# Altium footprint library Connector_Samtec_HLE_THT.PcbLib: 141 footprints (part 5 of 9)
Each footprint in its own frame and in the unit in brackets; x right, y up, seen from the top. Pads: shape width x height; smd on the part's side, far side on the other; paste and mask are expansions set on the pad; w line width, h text height; cw(c..) or ccw(c..) is an arc to the next point about the centre after c.
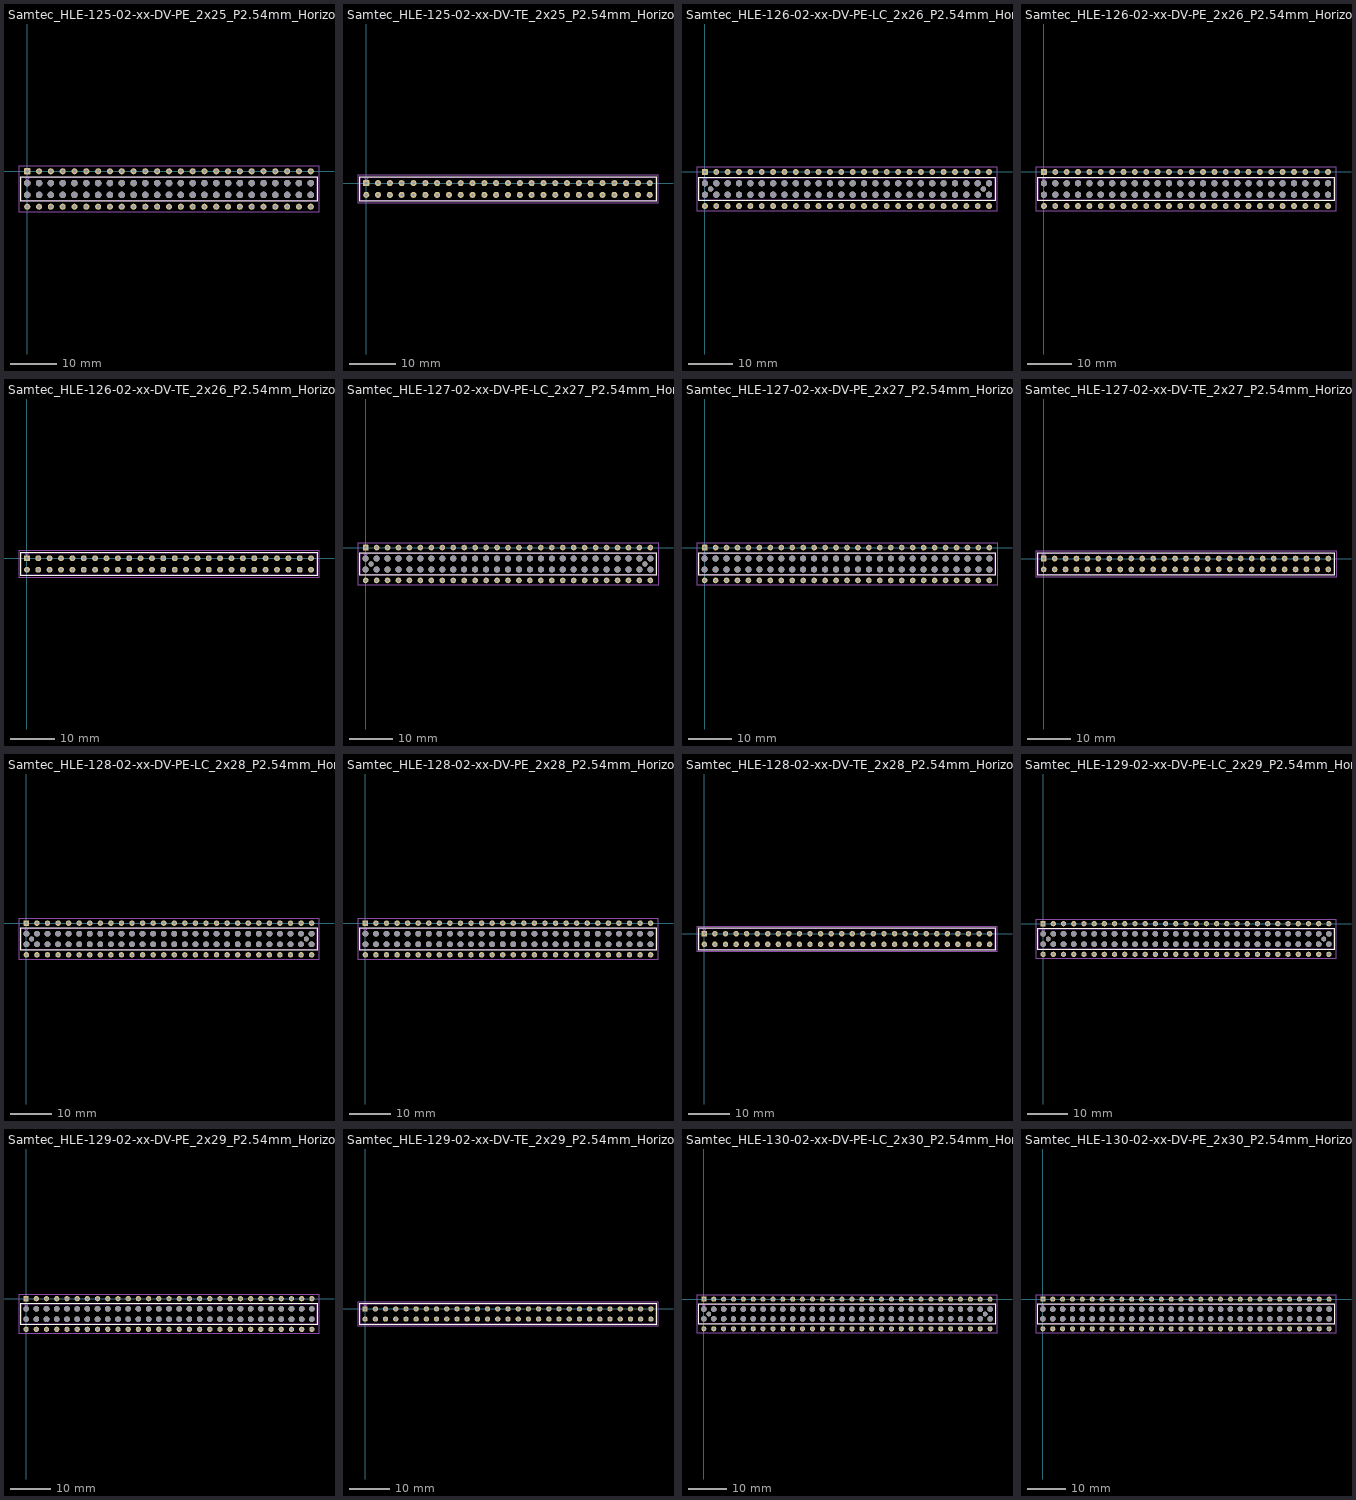
[diagram p4: the footprints below, top view; thin cyan lines are the x and y axes]

## Samtec_HLE-125-02-xx-DV-PE_2x25_P2.54mm_Horizontal [mm]
pads (100):
  rrect19% 1.31x1.31 hole 0.71: 1(0,0)
  round 1.31 hole 0.71: 2(0,-7.62) 3(2.54,0) 4(2.54,-7.62) 5(5.08,0) 6(5.08,-7.62) 7(7.62,0) 8(7.62,-7.62) 9(10.16,0) 10(10.16,-7.62) 11(12.7,0) 12(12.7,-7.62) 13(15.24,0) 14(15.24,-7.62) 15(17.78,0) 16(17.78,-7.62) 17(20.32,0) 18(20.32,-7.62) 19(22.86,0) 20(22.86,-7.62) 21(25.4,0) 22(25.4,-7.62) 23(27.94,0) 24(27.94,-7.62) 25(30.48,0) 26(30.48,-7.62) 27(33.02,0) 28(33.02,-7.62) 29(35.56,0) 30(35.56,-7.62) 31(38.1,0) 32(38.1,-7.62) 33(40.64,0) 34(40.64,-7.62) 35(43.18,0) 36(43.18,-7.62) 37(45.72,0) 38(45.72,-7.62) 39(48.26,0) 40(48.26,-7.62) 41(50.8,0) 42(50.8,-7.62) 43(53.34,0) 44(53.34,-7.62) 45(55.88,0) 46(55.88,-7.62) 47(58.42,0) 48(58.42,-7.62) 49(60.96,0) 50(60.96,-7.62)
  round 1.4 hole 1.4: Un1(35.56,-5.08) Un2(5.08,-2.54) Un3(27.94,-5.08) Un4(58.42,-2.54) Un5(40.64,-2.54) Un6(25.4,-5.08) Un7(43.18,-5.08) Un8(12.7,-5.08) Un9(33.02,-5.08) Un10(55.88,-2.54) Un11(12.7,-2.54) Un12(43.18,-2.54) Un13(53.34,-5.08) Un14(60.96,-2.54) Un15(22.86,-5.08) Un16(17.78,-5.08) Un17(30.48,-2.54) Un18(48.26,-2.54) Un19(0,-5.08) Un20(5.08,-5.08) Un21(55.88,-5.08) Un22(45.72,-5.08) Un23(40.64,-5.08) Un24(15.24,-2.54) Un25(38.1,-5.08) Un26(60.96,-5.08) Un27(17.78,-2.54) Un28(35.56,-2.54) Un29(2.54,-2.54) Un30(10.16,-5.08) Un31(48.26,-5.08) Un32(25.4,-2.54) Un33(58.42,-5.08) Un34(30.48,-5.08) Un35(20.32,-5.08) Un36(15.24,-5.08) Un37(53.34,-2.54) Un38(22.86,-2.54) Un39(33.02,-2.54) Un40(0,-2.54) Un41(2.54,-5.08) Un42(50.8,-2.54) Un43(10.16,-2.54) Un44(27.94,-2.54) Un45(38.1,-2.54) Un46(50.8,-5.08) Un47(7.62,-2.54) Un48(45.72,-2.54) Un49(20.32,-2.54) Un50(7.62,-5.08)
F.SilkS:
  lines w0.12: -1.38,-6.46 -1.38,-1.16 62.34,-1.16 62.34,-6.46 -1.38,-6.46
F.CrtYd:
  lines w0.05: -1.77,-8.78 62.73,-8.78 62.73,1.16 -1.77,1.16 -1.77,-8.78
F.Fab:
  lines w0.1: -0.5,-1.27 0,-1.977 0.5,-1.27 ; -1.27,-6.35 -1.27,-1.27 62.23,-1.27 62.23,-6.35 -1.27,-6.35
  text "'.Designator'" at 26.433,-6.49 h1

## Samtec_HLE-125-02-xx-DV-TE_2x25_P2.54mm_Horizontal [mm]
pads (50):
  rrect19% 1.31x1.31 hole 0.71: 1(0,0)
  round 1.31 hole 0.71: 2(0,-2.54) 3(2.54,0) 4(2.54,-2.54) 5(5.08,0) 6(5.08,-2.54) 7(7.62,0) 8(7.62,-2.54) 9(10.16,0) 10(10.16,-2.54) 11(12.7,0) 12(12.7,-2.54) 13(15.24,0) 14(15.24,-2.54) 15(17.78,0) 16(17.78,-2.54) 17(20.32,0) 18(20.32,-2.54) 19(22.86,0) 20(22.86,-2.54) 21(25.4,0) 22(25.4,-2.54) 23(27.94,0) 24(27.94,-2.54) 25(30.48,0) 26(30.48,-2.54) 27(33.02,0) 28(33.02,-2.54) 29(35.56,0) 30(35.56,-2.54) 31(38.1,0) 32(38.1,-2.54) 33(40.64,0) 34(40.64,-2.54) 35(43.18,0) 36(43.18,-2.54) 37(45.72,0) 38(45.72,-2.54) 39(48.26,0) 40(48.26,-2.54) 41(50.8,0) 42(50.8,-2.54) 43(53.34,0) 44(53.34,-2.54) 45(55.88,0) 46(55.88,-2.54) 47(58.42,0) 48(58.42,-2.54) 49(60.96,0) 50(60.96,-2.54)
F.SilkS:
  lines w0.12: -1.38,-3.92 62.34,-3.92 62.34,1.38 -1.38,1.38 -1.38,-3.92
F.CrtYd:
  lines w0.05: -1.77,-4.31 62.73,-4.31 62.73,1.77 -1.77,1.77 -1.77,-4.31
F.Fab:
  lines w0.1: -0.5,1.27 0,0.563 0.5,1.27 ; -1.27,-3.81 62.23,-3.81 62.23,1.27 -1.27,1.27 -1.27,-3.81
  text "'.Designator'" at 26.433,-3.95 h1

## Samtec_HLE-126-02-xx-DV-PE-LC_2x26_P2.54mm_Horizontal [mm]
pads (106):
  rrect19% 1.31x1.31 hole 0.71: 1(0,0)
  round 1.31 hole 0.71: 2(0,-7.62) 3(2.54,0) 4(2.54,-7.62) 5(5.08,0) 6(5.08,-7.62) 7(7.62,0) 8(7.62,-7.62) 9(10.16,0) 10(10.16,-7.62) 11(12.7,0) 12(12.7,-7.62) 13(15.24,0) 14(15.24,-7.62) 15(17.78,0) 16(17.78,-7.62) 17(20.32,0) 18(20.32,-7.62) 19(22.86,0) 20(22.86,-7.62) 21(25.4,0) 22(25.4,-7.62) 23(27.94,0) 24(27.94,-7.62) 25(30.48,0) 26(30.48,-7.62) 27(33.02,0) 28(33.02,-7.62) 29(35.56,0) 30(35.56,-7.62) 31(38.1,0) 32(38.1,-7.62) 33(40.64,0) 34(40.64,-7.62) 35(43.18,0) 36(43.18,-7.62) 37(45.72,0) 38(45.72,-7.62) 39(48.26,0) 40(48.26,-7.62) 41(50.8,0) 42(50.8,-7.62) 43(53.34,0) 44(53.34,-7.62) 45(55.88,0) 46(55.88,-7.62) 47(58.42,0) 48(58.42,-7.62) 49(60.96,0) 50(60.96,-7.62) 51(63.5,0) 52(63.5,-7.62)
  round 1.4 hole 1.4: Un1(58.42,-2.54) Un2(22.86,-5.08) Un3(53.34,-5.08) Un4(20.32,-2.54) Un5(48.26,-5.08) Un6(5.08,-2.54) Un7(48.26,-2.54) Un8(2.54,-5.08) Un9(55.88,-2.54) Un10(40.64,-2.54) Un11(10.16,-2.54) Un12(15.24,-2.54) Un13(60.96,-2.54) Un14(53.34,-2.54) Un15(35.56,-2.54) Un16(17.78,-2.54) Un17(5.08,-5.08) Un18(50.8,-2.54) Un19(38.1,-5.08) Un20(25.4,-2.54) Un22(43.18,-5.08) Un23(50.8,-5.08) Un24(30.48,-5.08) Un25(60.96,-5.08) Un26(12.7,-5.08) Un27(20.32,-5.08) Un28(63.5,-2.54) Un29(30.48,-2.54) Un30(10.16,-5.08) Un31(27.94,-5.08) Un32(12.7,-2.54) Un33(63.5,-5.08) Un34(0,-5.08) Un35(25.4,-5.08) Un36(55.88,-5.08) Un37(17.78,-5.08) Un39(38.1,-2.54) Un40(43.18,-2.54) Un41(27.94,-2.54) Un42(2.54,-2.54) Un43(33.02,-2.54) Un44(22.86,-2.54) Un45(45.72,-2.54) Un46(35.56,-5.08) Un47(15.24,-5.08) Un48(0,-2.54) Un49(7.62,-2.54) Un50(45.72,-5.08) Un51(58.42,-5.08) Un52(40.64,-5.08) Un53(33.02,-5.08) Un54(7.62,-5.08)
  round 1.19 hole 1.19: Un21(1.27,-3.81) Un38(62.23,-3.81)
F.SilkS:
  lines w0.12: -1.38,-6.46 -1.38,-1.16 64.88,-1.16 64.88,-6.46 -1.38,-6.46
F.CrtYd:
  lines w0.05: -1.77,-8.78 65.27,-8.78 65.27,1.16 -1.77,1.16 -1.77,-8.78
F.Fab:
  lines w0.1: -0.5,-1.27 0,-1.977 0.5,-1.27 ; -1.27,-6.35 64.77,-6.35 64.77,-1.27 -1.27,-1.27 -1.27,-6.35
  text "'.Designator'" at 27.703,-6.49 h1

## Samtec_HLE-126-02-xx-DV-PE_2x26_P2.54mm_Horizontal [mm]
pads (104):
  rrect19% 1.31x1.31 hole 0.71: 1(0,0)
  round 1.31 hole 0.71: 2(0,-7.62) 3(2.54,0) 4(2.54,-7.62) 5(5.08,0) 6(5.08,-7.62) 7(7.62,0) 8(7.62,-7.62) 9(10.16,0) 10(10.16,-7.62) 11(12.7,0) 12(12.7,-7.62) 13(15.24,0) 14(15.24,-7.62) 15(17.78,0) 16(17.78,-7.62) 17(20.32,0) 18(20.32,-7.62) 19(22.86,0) 20(22.86,-7.62) 21(25.4,0) 22(25.4,-7.62) 23(27.94,0) 24(27.94,-7.62) 25(30.48,0) 26(30.48,-7.62) 27(33.02,0) 28(33.02,-7.62) 29(35.56,0) 30(35.56,-7.62) 31(38.1,0) 32(38.1,-7.62) 33(40.64,0) 34(40.64,-7.62) 35(43.18,0) 36(43.18,-7.62) 37(45.72,0) 38(45.72,-7.62) 39(48.26,0) 40(48.26,-7.62) 41(50.8,0) 42(50.8,-7.62) 43(53.34,0) 44(53.34,-7.62) 45(55.88,0) 46(55.88,-7.62) 47(58.42,0) 48(58.42,-7.62) 49(60.96,0) 50(60.96,-7.62) 51(63.5,0) 52(63.5,-7.62)
  round 1.4 hole 1.4: Un1(17.78,-5.08) Un2(10.16,-5.08) Un3(5.08,-5.08) Un4(7.62,-5.08) Un5(17.78,-2.54) Un6(7.62,-2.54) Un7(10.16,-2.54) Un8(15.24,-5.08) Un9(48.26,-2.54) Un10(38.1,-5.08) Un11(58.42,-5.08) Un12(45.72,-5.08) Un13(40.64,-2.54) Un14(55.88,-5.08) Un15(63.5,-2.54) Un16(35.56,-5.08) Un17(2.54,-2.54) Un18(25.4,-2.54) Un19(53.34,-5.08) Un20(33.02,-2.54) Un21(25.4,-5.08) Un22(43.18,-5.08) Un23(0,-5.08) Un24(20.32,-2.54) Un25(60.96,-2.54) Un26(53.34,-2.54) Un27(30.48,-5.08) Un28(38.1,-2.54) Un29(12.7,-2.54) Un30(2.54,-5.08) Un31(33.02,-5.08) Un32(5.08,-2.54) Un33(40.64,-5.08) Un34(55.88,-2.54) Un35(63.5,-5.08) Un36(15.24,-2.54) Un37(27.94,-2.54) Un38(50.8,-5.08) Un39(22.86,-2.54) Un40(45.72,-2.54) Un41(48.26,-5.08) Un42(30.48,-2.54) Un43(12.7,-5.08) Un44(50.8,-2.54) Un45(27.94,-5.08) Un46(22.86,-5.08) Un47(58.42,-2.54) Un48(0,-2.54) Un49(35.56,-2.54) Un50(20.32,-5.08) Un51(43.18,-2.54) Un52(60.96,-5.08)
F.SilkS:
  lines w0.12: -1.38,-6.46 64.88,-6.46 64.88,-1.16 -1.38,-1.16 -1.38,-6.46
F.CrtYd:
  lines w0.05: -1.77,-8.78 -1.77,1.16 65.27,1.16 65.27,-8.78 -1.77,-8.78
F.Fab:
  lines w0.1: -0.5,-1.27 0,-1.977 0.5,-1.27 ; -1.27,-6.35 64.77,-6.35 64.77,-1.27 -1.27,-1.27 -1.27,-6.35
  text "'.Designator'" at 27.703,-6.49 h1

## Samtec_HLE-126-02-xx-DV-TE_2x26_P2.54mm_Horizontal [mm]
pads (52):
  rrect19% 1.31x1.31 hole 0.71: 1(0,0)
  round 1.31 hole 0.71: 2(0,-2.54) 3(2.54,0) 4(2.54,-2.54) 5(5.08,0) 6(5.08,-2.54) 7(7.62,0) 8(7.62,-2.54) 9(10.16,0) 10(10.16,-2.54) 11(12.7,0) 12(12.7,-2.54) 13(15.24,0) 14(15.24,-2.54) 15(17.78,0) 16(17.78,-2.54) 17(20.32,0) 18(20.32,-2.54) 19(22.86,0) 20(22.86,-2.54) 21(25.4,0) 22(25.4,-2.54) 23(27.94,0) 24(27.94,-2.54) 25(30.48,0) 26(30.48,-2.54) 27(33.02,0) 28(33.02,-2.54) 29(35.56,0) 30(35.56,-2.54) 31(38.1,0) 32(38.1,-2.54) 33(40.64,0) 34(40.64,-2.54) 35(43.18,0) 36(43.18,-2.54) 37(45.72,0) 38(45.72,-2.54) 39(48.26,0) 40(48.26,-2.54) 41(50.8,0) 42(50.8,-2.54) 43(53.34,0) 44(53.34,-2.54) 45(55.88,0) 46(55.88,-2.54) 47(58.42,0) 48(58.42,-2.54) 49(60.96,0) 50(60.96,-2.54) 51(63.5,0) 52(63.5,-2.54)
F.SilkS:
  lines w0.12: -1.38,-3.92 -1.38,1.38 64.88,1.38 64.88,-3.92 -1.38,-3.92
F.CrtYd:
  lines w0.05: -1.77,-4.31 65.27,-4.31 65.27,1.77 -1.77,1.77 -1.77,-4.31
F.Fab:
  lines w0.1: -0.5,1.27 0,0.563 0.5,1.27 ; -1.27,-3.81 -1.27,1.27 64.77,1.27 64.77,-3.81 -1.27,-3.81
  text "'.Designator'" at 27.703,-3.95 h1

## Samtec_HLE-127-02-xx-DV-PE-LC_2x27_P2.54mm_Horizontal [mm]
pads (110):
  rrect19% 1.31x1.31 hole 0.71: 1(0,0)
  round 1.31 hole 0.71: 2(0,-7.62) 3(2.54,0) 4(2.54,-7.62) 5(5.08,0) 6(5.08,-7.62) 7(7.62,0) 8(7.62,-7.62) 9(10.16,0) 10(10.16,-7.62) 11(12.7,0) 12(12.7,-7.62) 13(15.24,0) 14(15.24,-7.62) 15(17.78,0) 16(17.78,-7.62) 17(20.32,0) 18(20.32,-7.62) 19(22.86,0) 20(22.86,-7.62) 21(25.4,0) 22(25.4,-7.62) 23(27.94,0) 24(27.94,-7.62) 25(30.48,0) 26(30.48,-7.62) 27(33.02,0) 28(33.02,-7.62) 29(35.56,0) 30(35.56,-7.62) 31(38.1,0) 32(38.1,-7.62) 33(40.64,0) 34(40.64,-7.62) 35(43.18,0) 36(43.18,-7.62) 37(45.72,0) 38(45.72,-7.62) 39(48.26,0) 40(48.26,-7.62) 41(50.8,0) 42(50.8,-7.62) 43(53.34,0) 44(53.34,-7.62) 45(55.88,0) 46(55.88,-7.62) 47(58.42,0) 48(58.42,-7.62) 49(60.96,0) 50(60.96,-7.62) 51(63.5,0) 52(63.5,-7.62) 53(66.04,0) 54(66.04,-7.62)
  round 1.4 hole 1.4: Un1(7.62,-5.08) Un2(66.04,-2.54) Un3(0,-5.08) Un4(48.26,-2.54) Un5(27.94,-2.54) Un6(0,-2.54) Un7(17.78,-2.54) Un8(40.64,-5.08) Un9(25.4,-2.54) Un10(30.48,-5.08) Un11(15.24,-5.08) Un12(45.72,-2.54) Un13(30.48,-2.54) Un14(25.4,-5.08) Un15(40.64,-2.54) Un16(48.26,-5.08) Un17(2.54,-2.54) Un18(17.78,-5.08) Un19(22.86,-2.54) Un20(60.96,-5.08) Un22(55.88,-5.08) Un23(33.02,-5.08) Un24(50.8,-2.54) Un25(60.96,-2.54) Un26(22.86,-5.08) Un27(12.7,-5.08) Un28(10.16,-2.54) Un29(43.18,-5.08) Un30(35.56,-5.08) Un31(50.8,-5.08) Un32(38.1,-2.54) Un33(27.94,-5.08) Un34(55.88,-2.54) Un35(45.72,-5.08) Un37(15.24,-2.54) Un38(20.32,-2.54) Un39(35.56,-2.54) Un40(43.18,-2.54) Un41(38.1,-5.08) Un42(58.42,-5.08) Un43(53.34,-2.54) Un44(63.5,-2.54) Un45(58.42,-2.54) Un46(20.32,-5.08) Un47(7.62,-2.54) Un48(2.54,-5.08) Un49(33.02,-2.54) Un50(12.7,-2.54) Un51(63.5,-5.08) Un52(66.04,-5.08) Un53(10.16,-5.08) Un54(53.34,-5.08) Un55(5.08,-2.54) Un56(5.08,-5.08)
  round 1.19 hole 1.19: Un21(64.77,-3.81) Un36(1.27,-3.81)
F.SilkS:
  lines w0.12: -1.38,-6.46 67.42,-6.46 67.42,-1.16 -1.38,-1.16 -1.38,-6.46
F.CrtYd:
  lines w0.05: -1.77,-8.78 -1.77,1.16 67.81,1.16 67.81,-8.78 -1.77,-8.78
F.Fab:
  lines w0.1: -0.5,-1.27 0,-1.977 0.5,-1.27 ; -1.27,-6.35 -1.27,-1.27 67.31,-1.27 67.31,-6.35 -1.27,-6.35
  text "'.Designator'" at 28.973,-6.49 h1

## Samtec_HLE-127-02-xx-DV-PE_2x27_P2.54mm_Horizontal [mm]
pads (108):
  rrect19% 1.31x1.31 hole 0.71: 1(0,0)
  round 1.31 hole 0.71: 2(0,-7.62) 3(2.54,0) 4(2.54,-7.62) 5(5.08,0) 6(5.08,-7.62) 7(7.62,0) 8(7.62,-7.62) 9(10.16,0) 10(10.16,-7.62) 11(12.7,0) 12(12.7,-7.62) 13(15.24,0) 14(15.24,-7.62) 15(17.78,0) 16(17.78,-7.62) 17(20.32,0) 18(20.32,-7.62) 19(22.86,0) 20(22.86,-7.62) 21(25.4,0) 22(25.4,-7.62) 23(27.94,0) 24(27.94,-7.62) 25(30.48,0) 26(30.48,-7.62) 27(33.02,0) 28(33.02,-7.62) 29(35.56,0) 30(35.56,-7.62) 31(38.1,0) 32(38.1,-7.62) 33(40.64,0) 34(40.64,-7.62) 35(43.18,0) 36(43.18,-7.62) 37(45.72,0) 38(45.72,-7.62) 39(48.26,0) 40(48.26,-7.62) 41(50.8,0) 42(50.8,-7.62) 43(53.34,0) 44(53.34,-7.62) 45(55.88,0) 46(55.88,-7.62) 47(58.42,0) 48(58.42,-7.62) 49(60.96,0) 50(60.96,-7.62) 51(63.5,0) 52(63.5,-7.62) 53(66.04,0) 54(66.04,-7.62)
  round 1.4 hole 1.4: Un1(22.86,-5.08) Un2(0,-5.08) Un3(55.88,-2.54) Un4(53.34,-5.08) Un5(35.56,-5.08) Un6(15.24,-2.54) Un7(43.18,-5.08) Un8(5.08,-5.08) Un9(50.8,-2.54) Un10(60.96,-2.54) Un11(33.02,-2.54) Un12(2.54,-2.54) Un13(27.94,-5.08) Un14(35.56,-2.54) Un15(27.94,-2.54) Un16(40.64,-2.54) Un17(66.04,-2.54) Un18(12.7,-2.54) Un19(55.88,-5.08) Un20(45.72,-5.08) Un21(48.26,-5.08) Un22(2.54,-5.08) Un23(17.78,-5.08) Un24(43.18,-2.54) Un25(48.26,-2.54) Un26(63.5,-5.08) Un27(25.4,-5.08) Un28(7.62,-5.08) Un29(45.72,-2.54) Un30(38.1,-2.54) Un31(0,-2.54) Un32(30.48,-5.08) Un33(30.48,-2.54) Un34(15.24,-5.08) Un35(7.62,-2.54) Un36(25.4,-2.54) Un37(63.5,-2.54) Un38(58.42,-5.08) Un39(40.64,-5.08) Un40(10.16,-2.54) Un41(58.42,-2.54) Un42(33.02,-5.08) Un43(66.04,-5.08) Un44(17.78,-2.54) Un45(20.32,-5.08) Un46(22.86,-2.54) Un47(60.96,-5.08) Un48(5.08,-2.54) Un49(50.8,-5.08) Un50(12.7,-5.08) Un51(53.34,-2.54) Un52(38.1,-5.08) Un53(20.32,-2.54) Un54(10.16,-5.08)
F.SilkS:
  lines w0.12: -1.38,-6.46 67.42,-6.46 67.42,-1.16 -1.38,-1.16 -1.38,-6.46
F.CrtYd:
  lines w0.05: -1.77,-8.78 -1.77,1.16 67.81,1.16 67.81,-8.78 -1.77,-8.78
F.Fab:
  lines w0.1: -0.5,-1.27 0,-1.977 0.5,-1.27 ; -1.27,-6.35 -1.27,-1.27 67.31,-1.27 67.31,-6.35 -1.27,-6.35
  text "'.Designator'" at 28.973,-6.49 h1

## Samtec_HLE-127-02-xx-DV-TE_2x27_P2.54mm_Horizontal [mm]
pads (54):
  rrect19% 1.31x1.31 hole 0.71: 1(0,0)
  round 1.31 hole 0.71: 2(0,-2.54) 3(2.54,0) 4(2.54,-2.54) 5(5.08,0) 6(5.08,-2.54) 7(7.62,0) 8(7.62,-2.54) 9(10.16,0) 10(10.16,-2.54) 11(12.7,0) 12(12.7,-2.54) 13(15.24,0) 14(15.24,-2.54) 15(17.78,0) 16(17.78,-2.54) 17(20.32,0) 18(20.32,-2.54) 19(22.86,0) 20(22.86,-2.54) 21(25.4,0) 22(25.4,-2.54) 23(27.94,0) 24(27.94,-2.54) 25(30.48,0) 26(30.48,-2.54) 27(33.02,0) 28(33.02,-2.54) 29(35.56,0) 30(35.56,-2.54) 31(38.1,0) 32(38.1,-2.54) 33(40.64,0) 34(40.64,-2.54) 35(43.18,0) 36(43.18,-2.54) 37(45.72,0) 38(45.72,-2.54) 39(48.26,0) 40(48.26,-2.54) 41(50.8,0) 42(50.8,-2.54) 43(53.34,0) 44(53.34,-2.54) 45(55.88,0) 46(55.88,-2.54) 47(58.42,0) 48(58.42,-2.54) 49(60.96,0) 50(60.96,-2.54) 51(63.5,0) 52(63.5,-2.54) 53(66.04,0) 54(66.04,-2.54)
F.SilkS:
  lines w0.12: -1.38,-3.92 -1.38,1.38 67.42,1.38 67.42,-3.92 -1.38,-3.92
F.CrtYd:
  lines w0.05: -1.77,-4.31 -1.77,1.77 67.81,1.77 67.81,-4.31 -1.77,-4.31
F.Fab:
  lines w0.1: -0.5,1.27 0,0.563 0.5,1.27 ; -1.27,-3.81 67.31,-3.81 67.31,1.27 -1.27,1.27 -1.27,-3.81
  text "'.Designator'" at 28.973,-3.95 h1

## Samtec_HLE-128-02-xx-DV-PE-LC_2x28_P2.54mm_Horizontal [mm]
pads (114):
  rrect19% 1.31x1.31 hole 0.71: 1(0,0)
  round 1.31 hole 0.71: 2(0,-7.62) 3(2.54,0) 4(2.54,-7.62) 5(5.08,0) 6(5.08,-7.62) 7(7.62,0) 8(7.62,-7.62) 9(10.16,0) 10(10.16,-7.62) 11(12.7,0) 12(12.7,-7.62) 13(15.24,0) 14(15.24,-7.62) 15(17.78,0) 16(17.78,-7.62) 17(20.32,0) 18(20.32,-7.62) 19(22.86,0) 20(22.86,-7.62) 21(25.4,0) 22(25.4,-7.62) 23(27.94,0) 24(27.94,-7.62) 25(30.48,0) 26(30.48,-7.62) 27(33.02,0) 28(33.02,-7.62) 29(35.56,0) 30(35.56,-7.62) 31(38.1,0) 32(38.1,-7.62) 33(40.64,0) 34(40.64,-7.62) 35(43.18,0) 36(43.18,-7.62) 37(45.72,0) 38(45.72,-7.62) 39(48.26,0) 40(48.26,-7.62) 41(50.8,0) 42(50.8,-7.62) 43(53.34,0) 44(53.34,-7.62) 45(55.88,0) 46(55.88,-7.62) 47(58.42,0) 48(58.42,-7.62) 49(60.96,0) 50(60.96,-7.62) 51(63.5,0) 52(63.5,-7.62) 53(66.04,0) 54(66.04,-7.62) 55(68.58,0) 56(68.58,-7.62)
  round 1.4 hole 1.4: Un1(66.04,-2.54) Un2(5.08,-5.08) Un3(63.5,-5.08) Un4(2.54,-2.54) Un5(40.64,-5.08) Un6(66.04,-5.08) Un7(53.34,-5.08) Un8(12.7,-2.54) Un9(2.54,-5.08) Un10(30.48,-2.54) Un11(50.8,-5.08) Un12(63.5,-2.54) Un13(15.24,-2.54) Un14(33.02,-2.54) Un15(48.26,-2.54) Un16(20.32,-2.54) Un17(45.72,-2.54) Un18(30.48,-5.08) Un19(25.4,-2.54) Un20(7.62,-5.08) Un21(27.94,-5.08) Un22(0,-5.08) Un23(45.72,-5.08) Un24(58.42,-5.08) Un25(33.02,-5.08) Un26(38.1,-2.54) Un28(12.7,-5.08) Un29(43.18,-5.08) Un31(53.34,-2.54) Un32(35.56,-5.08) Un33(5.08,-2.54) Un34(68.58,-2.54) Un35(55.88,-2.54) Un36(48.26,-5.08) Un37(22.86,-5.08) Un38(60.96,-5.08) Un39(35.56,-2.54) Un40(20.32,-5.08) Un41(17.78,-2.54) Un42(0,-2.54) Un43(17.78,-5.08) Un44(22.86,-2.54) Un45(10.16,-2.54) Un46(15.24,-5.08) Un47(60.96,-2.54) Un48(43.18,-2.54) Un49(38.1,-5.08) Un50(50.8,-2.54) Un51(27.94,-2.54) Un52(40.64,-2.54) Un53(7.62,-2.54) Un54(58.42,-2.54) Un55(55.88,-5.08) Un56(68.58,-5.08) Un57(10.16,-5.08) Un58(25.4,-5.08)
  round 1.19 hole 1.19: Un27(67.31,-3.81) Un30(1.27,-3.81)
F.SilkS:
  lines w0.12: -1.38,-6.46 -1.38,-1.16 69.96,-1.16 69.96,-6.46 -1.38,-6.46
F.CrtYd:
  lines w0.05: -1.77,-8.78 -1.77,1.16 70.35,1.16 70.35,-8.78 -1.77,-8.78
F.Fab:
  lines w0.1: -0.5,-1.27 0,-1.977 0.5,-1.27 ; -1.27,-6.35 -1.27,-1.27 69.85,-1.27 69.85,-6.35 -1.27,-6.35
  text "'.Designator'" at 30.243,-6.49 h1

## Samtec_HLE-128-02-xx-DV-PE_2x28_P2.54mm_Horizontal [mm]
pads (112):
  rrect19% 1.31x1.31 hole 0.71: 1(0,0)
  round 1.31 hole 0.71: 2(0,-7.62) 3(2.54,0) 4(2.54,-7.62) 5(5.08,0) 6(5.08,-7.62) 7(7.62,0) 8(7.62,-7.62) 9(10.16,0) 10(10.16,-7.62) 11(12.7,0) 12(12.7,-7.62) 13(15.24,0) 14(15.24,-7.62) 15(17.78,0) 16(17.78,-7.62) 17(20.32,0) 18(20.32,-7.62) 19(22.86,0) 20(22.86,-7.62) 21(25.4,0) 22(25.4,-7.62) 23(27.94,0) 24(27.94,-7.62) 25(30.48,0) 26(30.48,-7.62) 27(33.02,0) 28(33.02,-7.62) 29(35.56,0) 30(35.56,-7.62) 31(38.1,0) 32(38.1,-7.62) 33(40.64,0) 34(40.64,-7.62) 35(43.18,0) 36(43.18,-7.62) 37(45.72,0) 38(45.72,-7.62) 39(48.26,0) 40(48.26,-7.62) 41(50.8,0) 42(50.8,-7.62) 43(53.34,0) 44(53.34,-7.62) 45(55.88,0) 46(55.88,-7.62) 47(58.42,0) 48(58.42,-7.62) 49(60.96,0) 50(60.96,-7.62) 51(63.5,0) 52(63.5,-7.62) 53(66.04,0) 54(66.04,-7.62) 55(68.58,0) 56(68.58,-7.62)
  round 1.4 hole 1.4: Un1(33.02,-2.54) Un2(2.54,-2.54) Un3(45.72,-2.54) Un4(5.08,-5.08) Un5(58.42,-2.54) Un6(17.78,-2.54) Un7(55.88,-5.08) Un8(22.86,-5.08) Un9(63.5,-5.08) Un10(2.54,-5.08) Un11(48.26,-5.08) Un12(5.08,-2.54) Un13(30.48,-2.54) Un14(27.94,-5.08) Un15(60.96,-2.54) Un16(15.24,-5.08) Un17(10.16,-2.54) Un18(12.7,-2.54) Un19(48.26,-2.54) Un20(38.1,-5.08) Un21(33.02,-5.08) Un22(68.58,-2.54) Un23(20.32,-2.54) Un24(43.18,-5.08) Un25(17.78,-5.08) Un26(43.18,-2.54) Un27(10.16,-5.08) Un28(0,-2.54) Un29(12.7,-5.08) Un30(66.04,-2.54) Un31(30.48,-5.08) Un32(58.42,-5.08) Un33(53.34,-2.54) Un34(60.96,-5.08) Un35(55.88,-2.54) Un36(50.8,-2.54) Un37(66.04,-5.08) Un38(38.1,-2.54) Un39(53.34,-5.08) Un40(7.62,-5.08) Un41(50.8,-5.08) Un42(25.4,-5.08) Un43(63.5,-2.54) Un44(35.56,-5.08) Un45(25.4,-2.54) Un46(68.58,-5.08) Un47(40.64,-2.54) Un48(7.62,-2.54) Un49(27.94,-2.54) Un50(20.32,-5.08) Un51(15.24,-2.54) Un52(22.86,-2.54) Un53(45.72,-5.08) Un54(35.56,-2.54) Un55(0,-5.08) Un56(40.64,-5.08)
F.SilkS:
  lines w0.12: -1.38,-6.46 -1.38,-1.16 69.96,-1.16 69.96,-6.46 -1.38,-6.46
F.CrtYd:
  lines w0.05: -1.77,-8.78 70.35,-8.78 70.35,1.16 -1.77,1.16 -1.77,-8.78
F.Fab:
  lines w0.1: -0.5,-1.27 0,-1.977 0.5,-1.27 ; -1.27,-6.35 69.85,-6.35 69.85,-1.27 -1.27,-1.27 -1.27,-6.35
  text "'.Designator'" at 30.243,-6.49 h1

## Samtec_HLE-128-02-xx-DV-TE_2x28_P2.54mm_Horizontal [mm]
pads (56):
  rrect19% 1.31x1.31 hole 0.71: 1(0,0)
  round 1.31 hole 0.71: 2(0,-2.54) 3(2.54,0) 4(2.54,-2.54) 5(5.08,0) 6(5.08,-2.54) 7(7.62,0) 8(7.62,-2.54) 9(10.16,0) 10(10.16,-2.54) 11(12.7,0) 12(12.7,-2.54) 13(15.24,0) 14(15.24,-2.54) 15(17.78,0) 16(17.78,-2.54) 17(20.32,0) 18(20.32,-2.54) 19(22.86,0) 20(22.86,-2.54) 21(25.4,0) 22(25.4,-2.54) 23(27.94,0) 24(27.94,-2.54) 25(30.48,0) 26(30.48,-2.54) 27(33.02,0) 28(33.02,-2.54) 29(35.56,0) 30(35.56,-2.54) 31(38.1,0) 32(38.1,-2.54) 33(40.64,0) 34(40.64,-2.54) 35(43.18,0) 36(43.18,-2.54) 37(45.72,0) 38(45.72,-2.54) 39(48.26,0) 40(48.26,-2.54) 41(50.8,0) 42(50.8,-2.54) 43(53.34,0) 44(53.34,-2.54) 45(55.88,0) 46(55.88,-2.54) 47(58.42,0) 48(58.42,-2.54) 49(60.96,0) 50(60.96,-2.54) 51(63.5,0) 52(63.5,-2.54) 53(66.04,0) 54(66.04,-2.54) 55(68.58,0) 56(68.58,-2.54)
F.SilkS:
  lines w0.12: -1.38,-3.92 69.96,-3.92 69.96,1.38 -1.38,1.38 -1.38,-3.92
F.CrtYd:
  lines w0.05: -1.77,-4.31 70.35,-4.31 70.35,1.77 -1.77,1.77 -1.77,-4.31
F.Fab:
  lines w0.1: -0.5,1.27 0,0.563 0.5,1.27 ; -1.27,-3.81 69.85,-3.81 69.85,1.27 -1.27,1.27 -1.27,-3.81
  text "'.Designator'" at 30.243,-3.95 h1

## Samtec_HLE-129-02-xx-DV-PE-LC_2x29_P2.54mm_Horizontal [mm]
pads (118):
  rrect19% 1.31x1.31 hole 0.71: 1(0,0)
  round 1.31 hole 0.71: 2(0,-7.62) 3(2.54,0) 4(2.54,-7.62) 5(5.08,0) 6(5.08,-7.62) 7(7.62,0) 8(7.62,-7.62) 9(10.16,0) 10(10.16,-7.62) 11(12.7,0) 12(12.7,-7.62) 13(15.24,0) 14(15.24,-7.62) 15(17.78,0) 16(17.78,-7.62) 17(20.32,0) 18(20.32,-7.62) 19(22.86,0) 20(22.86,-7.62) 21(25.4,0) 22(25.4,-7.62) 23(27.94,0) 24(27.94,-7.62) 25(30.48,0) 26(30.48,-7.62) 27(33.02,0) 28(33.02,-7.62) 29(35.56,0) 30(35.56,-7.62) 31(38.1,0) 32(38.1,-7.62) 33(40.64,0) 34(40.64,-7.62) 35(43.18,0) 36(43.18,-7.62) 37(45.72,0) 38(45.72,-7.62) 39(48.26,0) 40(48.26,-7.62) 41(50.8,0) 42(50.8,-7.62) 43(53.34,0) 44(53.34,-7.62) 45(55.88,0) 46(55.88,-7.62) 47(58.42,0) 48(58.42,-7.62) 49(60.96,0) 50(60.96,-7.62) 51(63.5,0) 52(63.5,-7.62) 53(66.04,0) 54(66.04,-7.62) 55(68.58,0) 56(68.58,-7.62) 57(71.12,0) 58(71.12,-7.62)
  round 1.4 hole 1.4: Un1(35.56,-5.08) Un2(30.48,-5.08) Un3(55.88,-5.08) Un4(33.02,-2.54) Un5(20.32,-2.54) Un6(53.34,-5.08) Un7(5.08,-5.08) Un8(2.54,-5.08) Un9(40.64,-2.54) Un10(45.72,-2.54) Un11(35.56,-2.54) Un12(12.7,-2.54) Un13(45.72,-5.08) Un14(66.04,-5.08) Un15(71.12,-5.08) Un16(63.5,-2.54) Un17(27.94,-2.54) Un18(53.34,-2.54) Un19(55.88,-2.54) Un20(43.18,-2.54) Un21(68.58,-2.54) Un22(30.48,-2.54) Un23(48.26,-5.08) Un24(15.24,-2.54) Un25(10.16,-5.08) Un26(7.62,-2.54) Un27(68.58,-5.08) Un28(63.5,-5.08) Un30(38.1,-2.54) Un31(17.78,-5.08) Un32(10.16,-2.54) Un33(50.8,-5.08) Un34(2.54,-2.54) Un35(27.94,-5.08) Un36(22.86,-2.54) Un37(66.04,-2.54) Un38(33.02,-5.08) Un40(20.32,-5.08) Un41(7.62,-5.08) Un42(0,-5.08) Un43(17.78,-2.54) Un44(25.4,-2.54) Un45(12.7,-5.08) Un46(0,-2.54) Un47(40.64,-5.08) Un48(60.96,-2.54) Un49(25.4,-5.08) Un50(50.8,-2.54) Un51(22.86,-5.08) Un52(43.18,-5.08) Un53(15.24,-5.08) Un54(58.42,-5.08) Un55(38.1,-5.08) Un56(5.08,-2.54) Un57(60.96,-5.08) Un58(71.12,-2.54) Un59(58.42,-2.54) Un60(48.26,-2.54)
  round 1.19 hole 1.19: Un29(69.85,-3.81) Un39(1.27,-3.81)
F.SilkS:
  lines w0.12: -1.38,-6.46 72.5,-6.46 72.5,-1.16 -1.38,-1.16 -1.38,-6.46
F.CrtYd:
  lines w0.05: -1.77,-8.78 72.89,-8.78 72.89,1.16 -1.77,1.16 -1.77,-8.78
F.Fab:
  lines w0.1: -0.5,-1.27 0,-1.977 0.5,-1.27 ; -1.27,-6.35 -1.27,-1.27 72.39,-1.27 72.39,-6.35 -1.27,-6.35
  text "'.Designator'" at 31.513,-6.49 h1

## Samtec_HLE-129-02-xx-DV-PE_2x29_P2.54mm_Horizontal [mm]
pads (116):
  rrect19% 1.31x1.31 hole 0.71: 1(0,0)
  round 1.31 hole 0.71: 2(0,-7.62) 3(2.54,0) 4(2.54,-7.62) 5(5.08,0) 6(5.08,-7.62) 7(7.62,0) 8(7.62,-7.62) 9(10.16,0) 10(10.16,-7.62) 11(12.7,0) 12(12.7,-7.62) 13(15.24,0) 14(15.24,-7.62) 15(17.78,0) 16(17.78,-7.62) 17(20.32,0) 18(20.32,-7.62) 19(22.86,0) 20(22.86,-7.62) 21(25.4,0) 22(25.4,-7.62) 23(27.94,0) 24(27.94,-7.62) 25(30.48,0) 26(30.48,-7.62) 27(33.02,0) 28(33.02,-7.62) 29(35.56,0) 30(35.56,-7.62) 31(38.1,0) 32(38.1,-7.62) 33(40.64,0) 34(40.64,-7.62) 35(43.18,0) 36(43.18,-7.62) 37(45.72,0) 38(45.72,-7.62) 39(48.26,0) 40(48.26,-7.62) 41(50.8,0) 42(50.8,-7.62) 43(53.34,0) 44(53.34,-7.62) 45(55.88,0) 46(55.88,-7.62) 47(58.42,0) 48(58.42,-7.62) 49(60.96,0) 50(60.96,-7.62) 51(63.5,0) 52(63.5,-7.62) 53(66.04,0) 54(66.04,-7.62) 55(68.58,0) 56(68.58,-7.62) 57(71.12,0) 58(71.12,-7.62)
  round 1.4 hole 1.4: Un1(17.78,-5.08) Un2(71.12,-5.08) Un3(53.34,-5.08) Un4(53.34,-2.54) Un5(66.04,-2.54) Un6(30.48,-5.08) Un7(43.18,-5.08) Un8(25.4,-2.54) Un9(71.12,-2.54) Un10(43.18,-2.54) Un11(63.5,-5.08) Un12(50.8,-5.08) Un13(58.42,-5.08) Un14(10.16,-5.08) Un15(30.48,-2.54) Un16(55.88,-5.08) Un17(35.56,-2.54) Un18(22.86,-5.08) Un19(27.94,-5.08) Un20(17.78,-2.54) Un21(45.72,-5.08) Un22(33.02,-5.08) Un23(0,-2.54) Un24(2.54,-5.08) Un25(66.04,-5.08) Un26(40.64,-2.54) Un27(5.08,-5.08) Un28(68.58,-5.08) Un29(50.8,-2.54) Un30(60.96,-5.08) Un31(12.7,-2.54) Un32(0,-5.08) Un33(12.7,-5.08) Un34(35.56,-5.08) Un35(68.58,-2.54) Un36(40.64,-5.08) Un37(20.32,-5.08) Un38(20.32,-2.54) Un39(63.5,-2.54) Un40(38.1,-2.54) Un41(15.24,-2.54) Un42(33.02,-2.54) Un43(48.26,-5.08) Un44(60.96,-2.54) Un45(7.62,-2.54) Un46(15.24,-5.08) Un47(38.1,-5.08) Un48(27.94,-2.54) Un49(58.42,-2.54) Un50(55.88,-2.54) Un51(22.86,-2.54) Un52(7.62,-5.08) Un53(25.4,-5.08) Un54(2.54,-2.54) Un55(48.26,-2.54) Un56(45.72,-2.54) Un57(10.16,-2.54) Un58(5.08,-2.54)
F.SilkS:
  lines w0.12: -1.38,-6.46 72.5,-6.46 72.5,-1.16 -1.38,-1.16 -1.38,-6.46
F.CrtYd:
  lines w0.05: -1.77,-8.78 -1.77,1.16 72.89,1.16 72.89,-8.78 -1.77,-8.78
F.Fab:
  lines w0.1: -0.5,-1.27 0,-1.977 0.5,-1.27 ; -1.27,-6.35 -1.27,-1.27 72.39,-1.27 72.39,-6.35 -1.27,-6.35
  text "'.Designator'" at 31.513,-6.49 h1

## Samtec_HLE-129-02-xx-DV-TE_2x29_P2.54mm_Horizontal [mm]
pads (58):
  rrect19% 1.31x1.31 hole 0.71: 1(0,0)
  round 1.31 hole 0.71: 2(0,-2.54) 3(2.54,0) 4(2.54,-2.54) 5(5.08,0) 6(5.08,-2.54) 7(7.62,0) 8(7.62,-2.54) 9(10.16,0) 10(10.16,-2.54) 11(12.7,0) 12(12.7,-2.54) 13(15.24,0) 14(15.24,-2.54) 15(17.78,0) 16(17.78,-2.54) 17(20.32,0) 18(20.32,-2.54) 19(22.86,0) 20(22.86,-2.54) 21(25.4,0) 22(25.4,-2.54) 23(27.94,0) 24(27.94,-2.54) 25(30.48,0) 26(30.48,-2.54) 27(33.02,0) 28(33.02,-2.54) 29(35.56,0) 30(35.56,-2.54) 31(38.1,0) 32(38.1,-2.54) 33(40.64,0) 34(40.64,-2.54) 35(43.18,0) 36(43.18,-2.54) 37(45.72,0) 38(45.72,-2.54) 39(48.26,0) 40(48.26,-2.54) 41(50.8,0) 42(50.8,-2.54) 43(53.34,0) 44(53.34,-2.54) 45(55.88,0) 46(55.88,-2.54) 47(58.42,0) 48(58.42,-2.54) 49(60.96,0) 50(60.96,-2.54) 51(63.5,0) 52(63.5,-2.54) 53(66.04,0) 54(66.04,-2.54) 55(68.58,0) 56(68.58,-2.54) 57(71.12,0) 58(71.12,-2.54)
F.SilkS:
  lines w0.12: -1.38,-3.92 -1.38,1.38 72.5,1.38 72.5,-3.92 -1.38,-3.92
F.CrtYd:
  lines w0.05: -1.77,-4.31 -1.77,1.77 72.89,1.77 72.89,-4.31 -1.77,-4.31
F.Fab:
  lines w0.1: -0.5,1.27 0,0.563 0.5,1.27 ; -1.27,-3.81 72.39,-3.81 72.39,1.27 -1.27,1.27 -1.27,-3.81
  text "'.Designator'" at 31.513,-3.95 h1

## Samtec_HLE-130-02-xx-DV-PE-LC_2x30_P2.54mm_Horizontal [mm]
pads (122):
  rrect19% 1.31x1.31 hole 0.71: 1(0,0)
  round 1.31 hole 0.71: 2(0,-7.62) 3(2.54,0) 4(2.54,-7.62) 5(5.08,0) 6(5.08,-7.62) 7(7.62,0) 8(7.62,-7.62) 9(10.16,0) 10(10.16,-7.62) 11(12.7,0) 12(12.7,-7.62) 13(15.24,0) 14(15.24,-7.62) 15(17.78,0) 16(17.78,-7.62) 17(20.32,0) 18(20.32,-7.62) 19(22.86,0) 20(22.86,-7.62) 21(25.4,0) 22(25.4,-7.62) 23(27.94,0) 24(27.94,-7.62) 25(30.48,0) 26(30.48,-7.62) 27(33.02,0) 28(33.02,-7.62) 29(35.56,0) 30(35.56,-7.62) 31(38.1,0) 32(38.1,-7.62) 33(40.64,0) 34(40.64,-7.62) 35(43.18,0) 36(43.18,-7.62) 37(45.72,0) 38(45.72,-7.62) 39(48.26,0) 40(48.26,-7.62) 41(50.8,0) 42(50.8,-7.62) 43(53.34,0) 44(53.34,-7.62) 45(55.88,0) 46(55.88,-7.62) 47(58.42,0) 48(58.42,-7.62) 49(60.96,0) 50(60.96,-7.62) 51(63.5,0) 52(63.5,-7.62) 53(66.04,0) 54(66.04,-7.62) 55(68.58,0) 56(68.58,-7.62) 57(71.12,0) 58(71.12,-7.62) 59(73.66,0) 60(73.66,-7.62)
  round 1.4 hole 1.4: Un1(7.62,-5.08) Un2(63.5,-2.54) Un3(15.24,-5.08) Un4(73.66,-2.54) Un5(53.34,-5.08) Un6(55.88,-2.54) Un7(60.96,-2.54) Un8(68.58,-5.08) Un9(30.48,-5.08) Un10(45.72,-5.08) Un11(66.04,-2.54) Un12(20.32,-5.08) Un13(7.62,-2.54) Un14(12.7,-5.08) Un16(22.86,-5.08) Un17(48.26,-5.08) Un18(35.56,-2.54) Un19(43.18,-5.08) Un20(27.94,-5.08) Un21(25.4,-5.08) Un22(0,-2.54) Un23(17.78,-2.54) Un24(58.42,-5.08) Un25(38.1,-5.08) Un26(60.96,-5.08) Un27(50.8,-5.08) Un28(66.04,-5.08) Un29(27.94,-2.54) Un30(58.42,-2.54) Un31(43.18,-2.54) Un32(12.7,-2.54) Un33(30.48,-2.54) Un34(2.54,-5.08) Un35(33.02,-5.08) Un36(55.88,-5.08) Un37(40.64,-2.54) Un38(45.72,-2.54) Un39(25.4,-2.54) Un40(73.66,-5.08) Un42(50.8,-2.54) Un43(22.86,-2.54) Un44(5.08,-5.08) Un45(35.56,-5.08) Un46(17.78,-5.08) Un47(10.16,-2.54) Un48(48.26,-2.54) Un49(0,-5.08) Un50(33.02,-2.54) Un51(53.34,-2.54) Un52(5.08,-2.54) Un53(63.5,-5.08) Un54(2.54,-2.54) Un55(40.64,-5.08) Un56(71.12,-5.08) Un57(71.12,-2.54) Un58(15.24,-2.54) Un59(38.1,-2.54) Un60(68.58,-2.54) Un61(20.32,-2.54) Un62(10.16,-5.08)
  round 1.19 hole 1.19: Un15(1.27,-3.81) Un41(72.39,-3.81)
F.SilkS:
  lines w0.12: -1.38,-6.46 75.04,-6.46 75.04,-1.16 -1.38,-1.16 -1.38,-6.46
F.CrtYd:
  lines w0.05: -1.77,-8.78 -1.77,1.16 75.43,1.16 75.43,-8.78 -1.77,-8.78
F.Fab:
  lines w0.1: -0.5,-1.27 0,-1.977 0.5,-1.27 ; -1.27,-6.35 -1.27,-1.27 74.93,-1.27 74.93,-6.35 -1.27,-6.35
  text "'.Designator'" at 32.783,-6.49 h1

## Samtec_HLE-130-02-xx-DV-PE_2x30_P2.54mm_Horizontal [mm]
pads (120):
  rrect19% 1.31x1.31 hole 0.71: 1(0,0)
  round 1.31 hole 0.71: 2(0,-7.62) 3(2.54,0) 4(2.54,-7.62) 5(5.08,0) 6(5.08,-7.62) 7(7.62,0) 8(7.62,-7.62) 9(10.16,0) 10(10.16,-7.62) 11(12.7,0) 12(12.7,-7.62) 13(15.24,0) 14(15.24,-7.62) 15(17.78,0) 16(17.78,-7.62) 17(20.32,0) 18(20.32,-7.62) 19(22.86,0) 20(22.86,-7.62) 21(25.4,0) 22(25.4,-7.62) 23(27.94,0) 24(27.94,-7.62) 25(30.48,0) 26(30.48,-7.62) 27(33.02,0) 28(33.02,-7.62) 29(35.56,0) 30(35.56,-7.62) 31(38.1,0) 32(38.1,-7.62) 33(40.64,0) 34(40.64,-7.62) 35(43.18,0) 36(43.18,-7.62) 37(45.72,0) 38(45.72,-7.62) 39(48.26,0) 40(48.26,-7.62) 41(50.8,0) 42(50.8,-7.62) 43(53.34,0) 44(53.34,-7.62) 45(55.88,0) 46(55.88,-7.62) 47(58.42,0) 48(58.42,-7.62) 49(60.96,0) 50(60.96,-7.62) 51(63.5,0) 52(63.5,-7.62) 53(66.04,0) 54(66.04,-7.62) 55(68.58,0) 56(68.58,-7.62) 57(71.12,0) 58(71.12,-7.62) 59(73.66,0) 60(73.66,-7.62)
  round 1.4 hole 1.4: Un1(48.26,-2.54) Un2(48.26,-5.08) Un3(20.32,-5.08) Un4(66.04,-2.54) Un5(60.96,-2.54) Un6(27.94,-2.54) Un7(20.32,-2.54) Un8(22.86,-5.08) Un9(2.54,-2.54) Un10(50.8,-2.54) Un11(40.64,-2.54) Un12(71.12,-5.08) Un13(33.02,-5.08) Un14(43.18,-5.08) Un15(30.48,-2.54) Un16(73.66,-2.54) Un17(10.16,-2.54) Un18(5.08,-2.54) Un19(10.16,-5.08) Un20(35.56,-5.08) Un21(63.5,-5.08) Un22(5.08,-5.08) Un23(43.18,-2.54) Un24(60.96,-5.08) Un25(68.58,-5.08) Un26(53.34,-5.08) Un27(25.4,-5.08) Un28(22.86,-2.54) Un29(58.42,-2.54) Un30(0,-5.08) Un31(15.24,-5.08) Un32(50.8,-5.08) Un33(45.72,-5.08) Un34(17.78,-5.08) Un35(40.64,-5.08) Un36(12.7,-2.54) Un37(66.04,-5.08) Un38(35.56,-2.54) Un39(25.4,-2.54) Un40(53.34,-2.54) Un41(0,-2.54) Un42(58.42,-5.08) Un43(68.58,-2.54) Un44(45.72,-2.54) Un45(33.02,-2.54) Un46(7.62,-2.54) Un47(71.12,-2.54) Un48(38.1,-2.54) Un49(15.24,-2.54) Un50(7.62,-5.08) Un51(38.1,-5.08) Un52(55.88,-5.08) Un53(27.94,-5.08) Un54(12.7,-5.08) Un55(63.5,-2.54) Un56(55.88,-2.54) Un57(17.78,-2.54) Un58(30.48,-5.08) Un59(2.54,-5.08) Un60(73.66,-5.08)
F.SilkS:
  lines w0.12: -1.38,-6.46 -1.38,-1.16 75.04,-1.16 75.04,-6.46 -1.38,-6.46
F.CrtYd:
  lines w0.05: -1.77,-8.78 75.43,-8.78 75.43,1.16 -1.77,1.16 -1.77,-8.78
F.Fab:
  lines w0.1: -0.5,-1.27 0,-1.977 0.5,-1.27 ; -1.27,-6.35 74.93,-6.35 74.93,-1.27 -1.27,-1.27 -1.27,-6.35
  text "'.Designator'" at 32.783,-6.49 h1